# Altium footprint library TarabusLibrary.PcbLib: 591 footprints (part 21 of 37)
Each footprint in its own frame and in the unit in brackets; x right, y up, seen from the top. Pads: shape width x height; smd on the part's side, far side on the other; paste and mask are expansions set on the pad; w line width, h text height; cw(c..) or ccw(c..) is an arc to the next point about the centre after c.
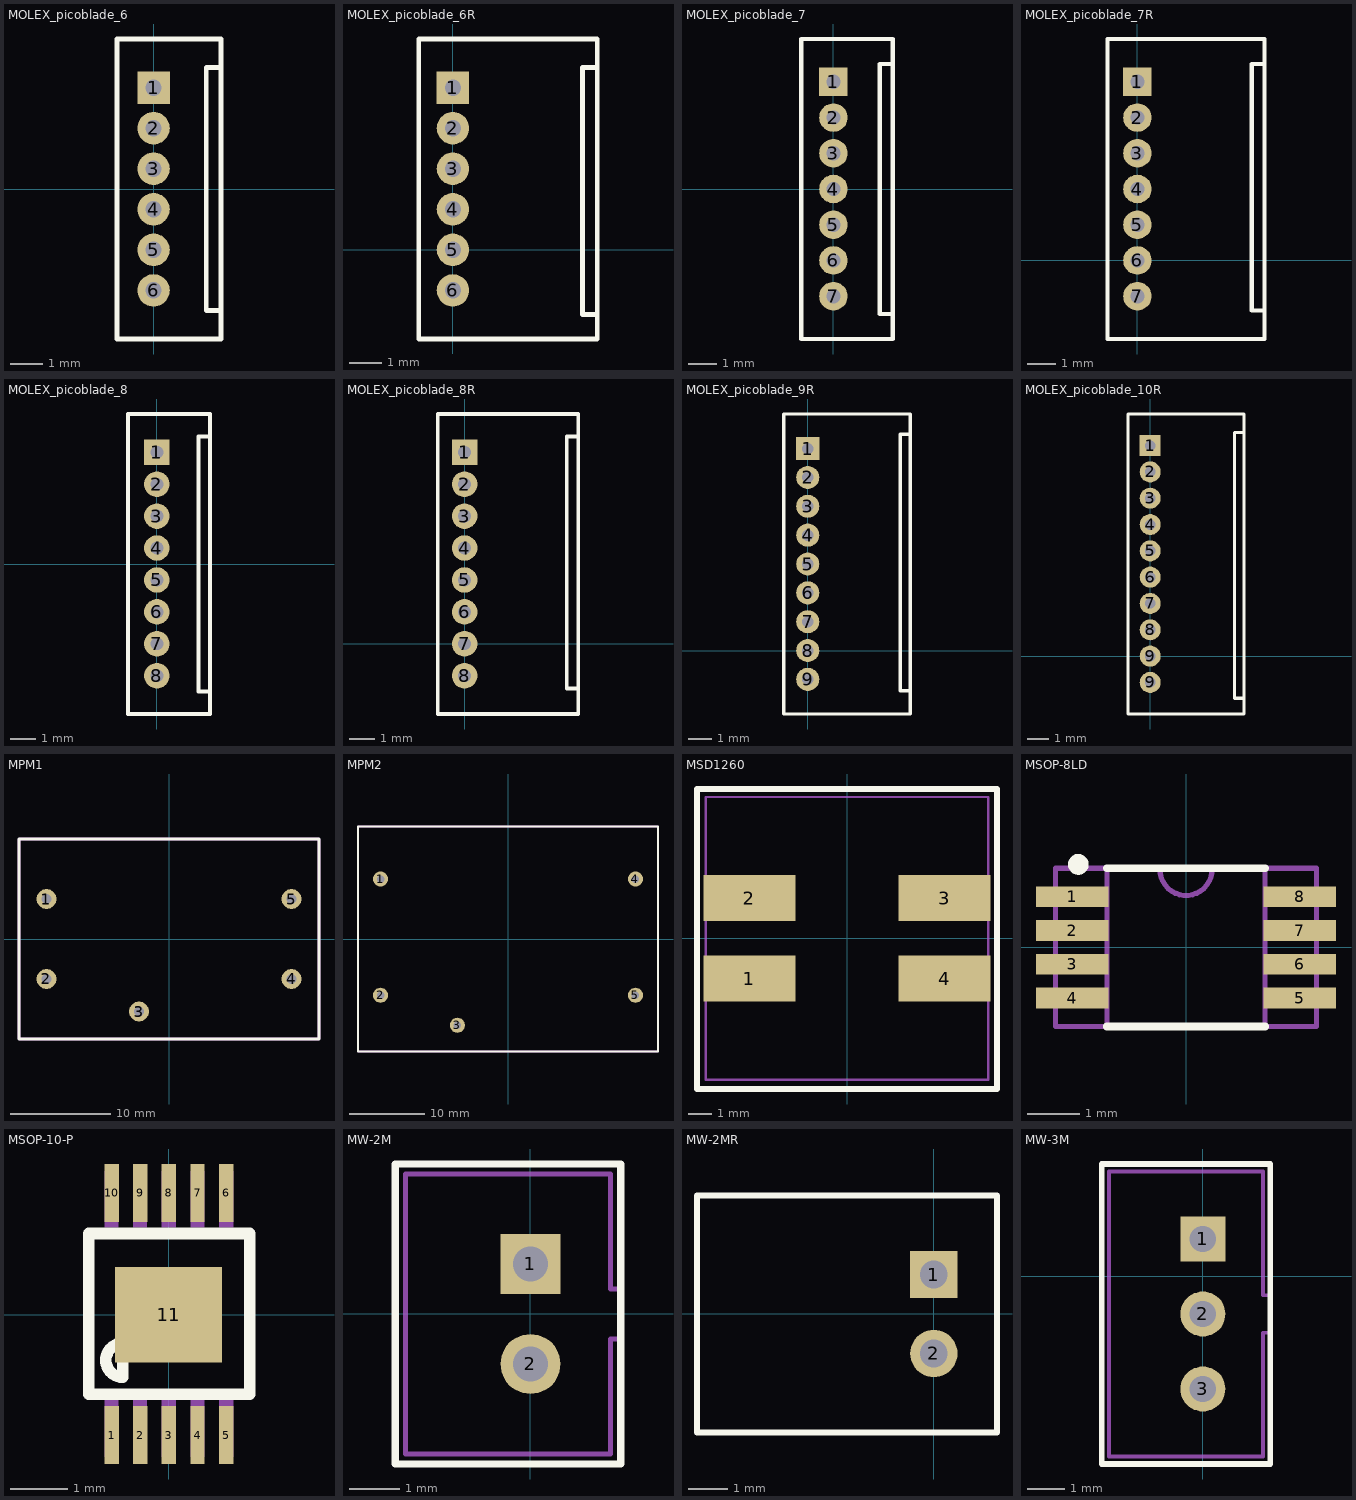
[diagram p20: the footprints below, top view; thin cyan lines are the x and y axes]

## MOLEX_picoblade_6 [mm]
height 4.2
pads (6):
  rect 1x1 hole 0.5 mask+0.15: 1(0,3.125)
  round 1 hole 0.5 mask+0.15: 2(0,1.875) 3(0,0.625) 4(0,-0.625) 5(0,-1.875) 6(0,-3.125)
Top Overlay:
  lines w0.15: 2.075,-3.75 1.625,-3.75 1.625,3.75 2.075,3.75 ; -1.125,-4.625 2.075,-4.625 2.075,4.625 -1.125,4.625 -1.125,-4.625
Mechanical 7:
  lines w0.1: 2.075,-3.75 1.625,-3.75 1.625,3.75 2.075,3.75 ; -1.125,-4.625 2.075,-4.625 2.075,4.625 -1.125,4.625 -1.125,-4.625
Mechanical 10:
  text ".Designator" at -0.78,5.555 h0.8
  text ".Comment" at -0.77,4.985 h0.6
3D body "530470610.STEP": height 4.22, standoff -2.18, extent -1.125,-4.625 2.075,4.625

## MOLEX_picoblade_6R [mm]
height 3.5
pads (6):
  rect 1x1 hole 0.5 mask+0.15: 1(0,5)
  round 1 hole 0.5 mask+0.15: 2(0,3.75) 3(0,2.5) 4(0,1.25) 5(0,0) 6(0,-1.25)
Top Overlay:
  lines w0.15: 4.45,-2 4,-2 4,5.625 4.45,5.625 ; -1.05,-2.75 4.45,-2.75 4.45,6.5 -1.05,6.5 -1.05,-2.75
Mechanical 7:
  lines w0.1: 4.45,-2 4,-2 4,5.625 4.45,5.625 ; -1.05,-2.75 -1.05,6.5 4.45,6.5 4.45,-2.75 -1.05,-2.75
Mechanical 10:
  text ".Designator" at 0.595,7.48 h0.8
  text ".Comment" at 0.605,6.91 h0.6

## MOLEX_picoblade_7 [mm]
height 4.2
pads (7):
  rect 1x1 hole 0.5 mask+0.15: 1(0,3.75)
  round 1 hole 0.5 mask+0.15: 2(0,2.5) 3(0,1.25) 4(0,0) 5(0,-1.25) 6(0,-2.5) 7(0,-3.75)
Top Overlay:
  lines w0.15: 2.075,-4.375 1.625,-4.375 1.625,4.375 2.075,4.375 ; -1.125,-5.25 2.075,-5.25 2.075,5.25 -1.125,5.25 -1.125,-5.25
Mechanical 7:
  lines w0.1: 2.075,-4.375 1.625,-4.375 1.625,4.375 2.075,4.375 ; -1.125,-5.25 2.075,-5.25 2.075,5.25 -1.125,5.25 -1.125,-5.25
Mechanical 10:
  text ".Designator" at -0.78,6.18 h0.8
  text ".Comment" at -0.77,5.61 h0.6
3D body "530470710.STEP": height 4.22, standoff -2.18, extent -1.125,-5.25 2.075,5.25

## MOLEX_picoblade_7R [mm]
height 3.5
pads (7):
  rect 1x1 hole 0.5 mask+0.15: 1(0,6.25)
  round 1 hole 0.5 mask+0.15: 2(0,5) 3(0,3.75) 4(0,2.5) 5(0,1.25) 6(0,0) 7(0,-1.25)
Top Overlay:
  lines w0.15: 4.45,-1.75 4,-1.75 4,6.875 4.45,6.875 ; -1.05,-2.75 -1.05,7.75 4.45,7.75 4.45,-2.75 -1.05,-2.75
Mechanical 7:
  lines w0.1: 4.45,-1.75 4,-1.75 4,6.875 4.45,6.875 ; -1.05,-2.75 4.45,-2.75 4.45,7.75 -1.05,7.75 -1.05,-2.75
Mechanical 10:
  text ".Comment" at 0.605,8.16 h0.6
  text ".Designator" at 0.595,8.73 h0.8

## MOLEX_picoblade_8 [mm]
height 4.2
pads (8):
  rect 1x1 hole 0.5 mask+0.15: 1(0,4.375)
  round 1 hole 0.5 mask+0.15: 2(0,3.125) 3(0,1.875) 4(0,0.625) 5(0,-0.625) 6(0,-1.875) 7(0,-3.125) 8(0,-4.375)
Top Overlay:
  lines w0.15: 2.075,-5 1.625,-5 1.625,5 2.075,5 ; -1.125,-5.875 2.075,-5.875 2.075,5.875 -1.125,5.875 -1.125,-5.875
Mechanical 7:
  lines w0.1: 2.075,-5 1.625,-5 1.625,5 2.075,5 ; -1.125,-5.875 2.075,-5.875 2.075,5.875 -1.125,5.875 -1.125,-5.875
Mechanical 10:
  text ".Designator" at -0.78,6.805 h0.8
  text ".Comment" at -0.77,6.235 h0.6
3D body "530470810.STEP": height 4.22, standoff -2.18, extent -1.125,-5.875 2.075,5.875

## MOLEX_picoblade_8R [mm]
height 3.5
pads (8):
  rect 1x1 hole 0.5 mask+0.15: 1(0,7.5)
  round 1 hole 0.5 mask+0.15: 2(0,6.25) 3(0,5) 4(0,3.75) 5(0,2.5) 6(0,1.25) 7(0,0) 8(0,-1.25)
Top Overlay:
  lines w0.15: 4.45,-1.75 4,-1.75 4,8.125 4.45,8.125 ; -1.05,-2.75 4.45,-2.75 4.45,9 -1.05,9 -1.05,-2.75
Mechanical 7:
  lines w0.1: 4.45,-1.75 4,-1.75 4,8.125 4.45,8.125 ; -1.05,-2.75 -1.05,9 4.45,9 4.45,-2.75 -1.05,-2.75
Mechanical 10:
  text ".Designator" at 0.595,9.98 h0.8
  text ".Comment" at 0.605,9.41 h0.6

## MOLEX_picoblade_9R [mm]
height 3.5
pads (9):
  rect 1x1 hole 0.5 mask+0.15: 1(0,8.75)
  round 1 hole 0.5 mask+0.15: 2(0,7.5) 3(0,6.25) 4(0,5) 5(0,3.75) 6(0,2.5) 7(0,1.25) 8(0,0) 9(0,-1.25)
Top Overlay:
  lines w0.15: 4.45,-1.75 4,-1.75 4,9.375 4.45,9.375 ; -1.05,-2.75 4.45,-2.75 4.45,10.25 -1.05,10.25 -1.05,-2.75
Mechanical 7:
  lines w0.1: 4.45,-1.75 4,-1.75 4,9.375 4.45,9.375 ; -1.05,-2.75 -1.05,10.25 4.45,10.25 4.45,-2.75 -1.05,-2.75
Mechanical 10:
  text ".Designator" at 0.595,11.23 h0.8
  text ".Comment" at 0.605,10.66 h0.6

## MOLEX_picoblade_10R [mm]
height 3.5
pads (10):
  rect 1x1 hole 0.5 mask+0.15: 1(0,10)
  round 1 hole 0.5 mask+0.15: 2(0,8.75) 3(0,7.5) 4(0,6.25) 5(0,5) 6(0,3.75) 7(0,2.5) 8(0,1.25) 9(0,-1.25) 9(0,0)
Top Overlay:
  lines w0.15: 4.45,-2 4,-2 4,10.625 4.45,10.625 ; -1.05,-2.75 4.45,-2.75 4.45,11.5 -1.05,11.5 -1.05,-2.75
Mechanical 7:
  lines w0.1: 4.45,-2 4,-2 4,10.625 4.45,10.625 ; -1.05,-2.75 -1.05,11.5 4.45,11.5 4.45,-2.75 -1.05,-2.75
Mechanical 10:
  text ".Designator" at -0.5,11.75 h0.8
  text ".Comment" at -0.5,12.25 h0.6

## MPM1 [mm]
height 10
pads (5):
  round 2 hole 1: 1(-12.25,4) 2(-12.25,-4) 3(-3,-7.25) 4(12.25,-4) 5(12.25,4)
Top Overlay:
  lines w0.254: -15,-10 15,-10 15,10 -15,10 -15,-10
Mechanical 7:
  lines w0.254: -15,-10 -15,10 15,10 15,-10 -15,-10
3D body: height 10, standoff 0.05, extent -15,-10 15,10

## MPM2 [mm]
height 10
pads (5):
  round 2 hole 1: 1(-17,8) 2(-17,-7.5) 3(-6.75,-11.5) 4(17,8) 5(17,-7.5)
Top Overlay:
  lines w0.254: -20,-15 -20,15 20,15 20,-15 -20,-15
Mechanical 7:
  lines w0.254: -20,-15 20,-15 20,15 -20,15 -20,-15
3D body: height 10, standoff 0.05, extent -20,-15 20,15

## MSD1260 [mm]
height 6
pads (4):
  rect 4x2 smd mask+0.075: 1(-4.25,-1.75) 2(-4.25,1.75) 3(4.25,1.75) 4(4.25,-1.75)
Top Overlay:
  lines w0.254: -6.525,-6.55 -6.525,6.5 6.525,6.5 6.525,-6.55 -6.525,-6.55
Mechanical 7:
  lines w0.1: -6.15,-6.15 -6.15,6.15 6.15,6.15 6.15,-6.15 -6.15,-6.15
Mechanical 10:
  text ".Designator" at -1.225,-7.75 h0.8
  text ".Comment" at -1.4,7.725 h0.8
3D body: height 6, standoff 0, extent -6.15,-6.15 6.15,6.15

## MSOP-8LD [mm]
height 0.9
pads (8):
  rect 1.4x0.4 smd: 1(-2.19,0.975) 2(-2.19,0.325) 3(-2.19,-0.325) 4(-2.19,-0.975) 5(2.19,-0.975) 6(2.19,-0.325) 7(2.19,0.325) 8(2.19,0.975)
Top Overlay:
  circle w0.2: c-2.075,1.6 r0.1
  lines w0.15: -1.525,-1.525 1.525,-1.525 ; -1.525,1.525 1.525,1.525
Mechanical 7:
  lines w0.1: -1.525,-1.525 -1.525,1.525 ; -0.499,1.525 ccw(c0,1.5) 0.499,1.525 ; 1.525,-1.525 1.525,1.525 ; -2.515,-1.525 2.515,-1.525 2.515,1.525 -2.515,1.525 -2.515,-1.525
Mechanical 10:
  text ".Designator" at -0.67,2.04 h0.8
  text ".Comment" at -0.67,-2.26 h0.6
3D body: height 1.11, standoff 0, extent -1.525,-1.525 1.525,1.525
3D body: height 0.7, standoff 0, extent 1.525,-1.525 2.515,1.525
3D body: height 0.7, standoff 0, extent -2.515,-1.525 -1.525,1.525

## MSOP-10-P [mil]
pads (11):
  rect 10x40 smd: 1(-39.37,-83.19) 2(-19.68,-83.19) 3(0,-83.19) 4(20,-83.19) 5(40,-83.19) 6(40,84) 7(20,84) 8(0,84) 9(-19.68,84) 10(-39.37,84)
  rect 74x66 smd: 11(0,0)
Top Overlay:
  lines w8: -55.12,-55.12 56,-55.12 56,56 -55.12,56 -55.12,-55.12 ; -31.5,-43.31 cw(c-31.5,-31.5) -31.5,-19.68 -31.5,-43.31
Mechanical 16:
  rectangle: -44.27,-98.43 -34.43,-59.06
  rectangle: -24.58,-98.43 -14.74,-59.06
  rectangle: -4.9,-98.43 5,-59.06
  rectangle: 15,-98.43 25,-59.06
  rectangle: 35,-98.43 45,-59.06
  region: 45,99 35,99 35,60 45,60
  region: 25,99 15,99 15,60 25,60
  region: 5,99 -4.94,99 -4.94,60 5,60
  region: -14.79,99 -24.63,99 -24.63,60 -14.79,60
  region: -34.47,99 -44.31,99 -44.31,60 -34.47,60

## MW-2M [mm]
height 6
pads (2):
  rect 1.2x1.2 hole 0.7: 1(0,1)
  round 1.2 hole 0.7: 2(0,-1)
Top Overlay:
  lines w0.15: -2.7,-3 1.8,-3 1.8,3 -2.7,3 -2.7,-3
Mechanical 7:
  lines w0.1: 1.79,0.5 1.6,0.5 1.6,2.8 -2.5,2.8 -2.5,-2.8 1.6,-2.8 1.6,-0.5 1.8,-0.5 ; -2.7,-3 -2.7,3 1.8,3 1.8,-3 -2.7,-3
Mechanical 10:
  text ".Designator" at -1.28,3.98 h0.8
  text ".Comment" at -1.27,3.41 h0.6
3D body "User Library-MW-2M.step": height 6, standoff -3.2, extent -2.7,-3 1.8,3

## MW-2MR [mm]
height 4.5
pads (2):
  rect 1.2x1.2 hole 0.7: 1(0,1)
  round 1.2 hole 0.7: 2(0,-1)
Top Overlay:
  lines w0.15: -6,-3 -6,3 1.6,3 1.6,-3 -6,-3
Mechanical 7:
  lines w0.1: -6,-3 1.6,-3 1.6,3 -6,3 -6,-3
Mechanical 10:
  text ".Designator" at -3.43,4 h0.8
  text ".Comment" at -3.42,3.43 h0.6
3D body: height 4.5, standoff 0, extent -6,-3 1.6,3

## MW-3M [mm]
pads (3):
  rect 1.2x1.2 hole 0.7: 1(0,1)
  round 1.2 hole 0.7: 2(0,-1) 3(0,-3)
Top Overlay:
  lines w0.15: -2.7,-5 1.8,-5 1.8,3 -2.7,3 -2.7,-5
Mechanical 7:
  lines w0.1: 1.79,-0.5 1.6,-0.5 1.6,2.8 -2.5,2.8 -2.5,-4.8 1.6,-4.8 1.6,-1.5 1.8,-1.5 ; -2.7,-5 -2.7,3 1.8,3 1.8,-5 -2.7,-5
Mechanical 10:
  text ".Designator" at -1.28,3.98 h0.8
  text ".Comment" at -1.27,3.41 h0.6
3D body "B3B-PH-K-S.STEP": height 6, standoff -3.4, extent -2.7,-4.95 1.8,2.95